# Altium footprint library 电容.PcbLib: 186 footprints (part 8 of 12)
Each footprint in its own frame and in the unit in brackets; x right, y up, seen from the top. Pads: shape width x height; smd on the part's side, far side on the other; paste and mask are expansions set on the pad; w line width, h text height; cw(c..) or ccw(c..) is an arc to the next point about the centre after c.
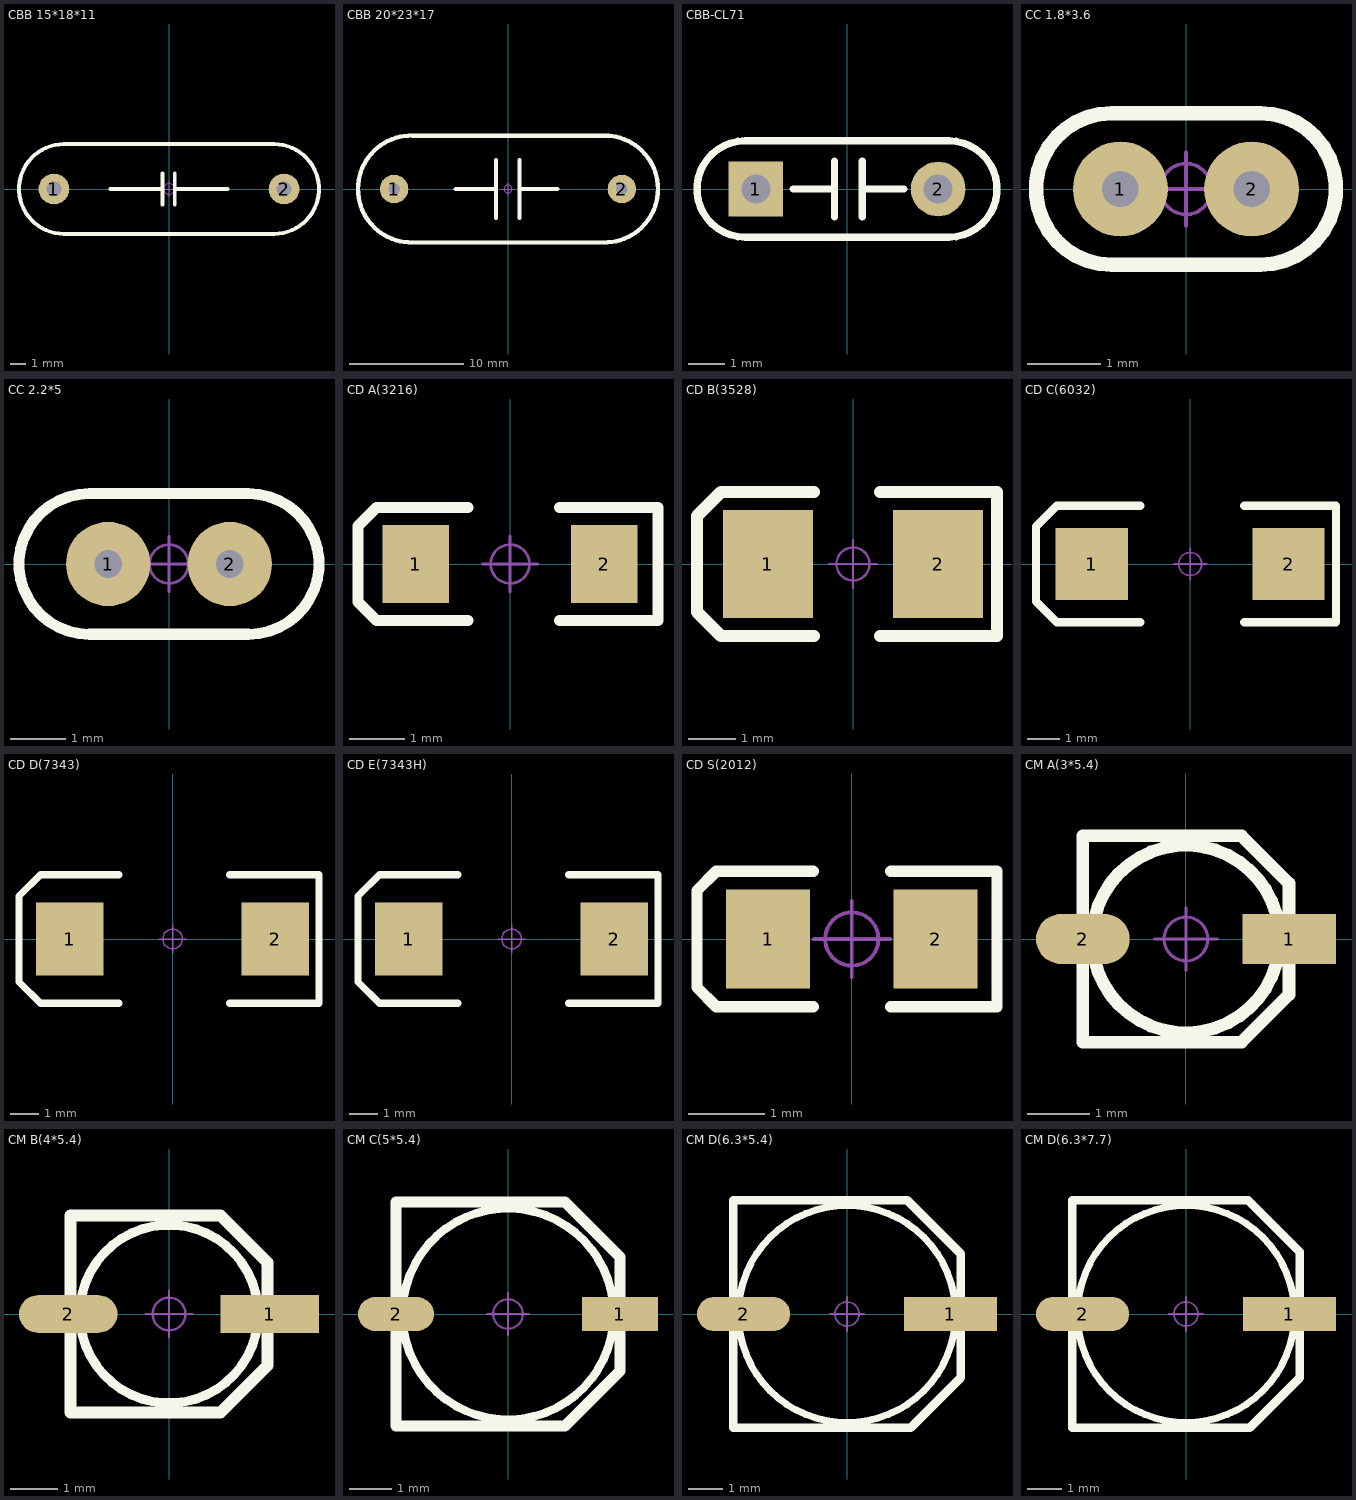
[diagram p7: the footprints below, top view; thin cyan lines are the x and y axes]

## CBB 15*18*11 [mm] "脚距15mm高18mm厚11mm"
pads (2):
  round 2 hole 1: 1(-7.5,0) 2(7.5,0)
Top Overlay:
  lines w0.254: -6.858,-2.921 6.858,-2.921 ccw(c6.858,0) 6.857,2.921 -6.858,2.921 ccw(c-6.858,0) -6.857,-2.921 ; -3.81,0 -0.515,0 ; -0.426,-1 -0.426,1 ; 0.374,-1 0.374,1 ; 0.501,0 3.81,0
Mechanical 15:
  circle w0.05: c0,0 r0.35
  lines w0.05: -0.5,0 0.5,0 ; 0,-0.5 0,0.5
3D body "CBB 15X18X11.STEP": height 11.53, standoff -3.47, extent -9,-2.75 9,2.75

## CBB 20*23*17 [mm] "脚距20mm高23mm厚17mm"
pads (2):
  round 2.5 hole 1: 1(-10,0) 2(10,0)
Top Overlay:
  lines w0.381: -8.382,4.682 8.89,4.682 ; -8.382,4.691 ccw(c-8.476,0) -8.382,-4.691 8.382,-4.691 ccw(c8.476,0) 8.382,4.691 ; -4.572,0 -1.277,0 ; -1.054,-2.54 -1.054,2.54 ; 1.016,-2.54 1.016,2.54 ; 1.016,0 4.318,0
Mechanical 15:
  circle w0.05: c0,0 r0.35
  lines w0.05: -0.5,0 0.5,0 ; 0,-0.5 0,0.5
3D body "CBB 20X23X17.STEP": height 17.53, standoff -3.47, extent -11.5,-4.5 11.5,4.5

## CBB-CL71 [mm] "7.2mm*2.3mm*6.5mm(长*宽*高）"
pads (2):
  rect 1.5x1.5 hole 0.8: 1(-2.5,0)
  round 1.5 hole 0.8: 2(2.5,0)
Top Overlay:
  lines w0.2: -1.484,0 -0.341,0 ; -0.341,-0.762 -0.341,0.762 ; 0.421,-0.762 0.421,0.762 ; 0.421,0 1.564,0 ; -2.794,-1.321 cw(c-2.794,0) -2.794,1.321 2.794,1.321 cw(c2.794,0) 2.794,-1.321 -2.794,-1.321
3D body "CL71.STEP": height 6.55, standoff -3.45, extent -3.6,-1.15 3.6,1.15

## CC 1.8*3.6 [mm] "脚距1.8mm直径3.6mm"
pads (2):
  round 1.3 hole 0.5: 1(-0.9,0) 2(0.9,0)
Top Overlay:
  lines w0.2: -1.016,-1.041 cw(c-1.016,0) -1.016,1.041 1.016,1.041 cw(c1.016,0) 1.016,-1.041 -1.016,-1.041
Mechanical 15:
  circle w0.05: c0,0 r0.35
  lines w0.05: -0.5,0 0.5,0 ; 0,-0.5 0,0.5
3D body "CC 1.8X3.6.STEP": height 3.6, standoff -3.5, extent -1.8,-0.798 1.8,0.796

## CC 2.2*5 [mm] "脚距2.2mm直径5mm"
height 6.35
pads (2):
  round 1.524 hole 0.5: 1(-1.1,0) 2(1.1,0)
Top Overlay:
  lines w0.2: -1.44,-1.271 cw(c-1.44,0) -1.44,1.271 1.44,1.271 cw(c1.44,0) 1.44,-1.271 -1.44,-1.269
Mechanical 15:
  circle w0.05: c0,0 r0.35
  lines w0.05: -0.5,0 0.5,0 ; 0,-0.5 0,0.5
3D body "CC 2.2X5.STEP": height 4.8, standoff -3.5, extent -2.4,-0.917 2.4,0.918

## CD A(3216) [mm] "长3.2mm，宽1.6mm，厚1.6mm"
pads (2):
  rect 1.2x1.4 smd: 1(-1.7,0) 2(1.7,0)
Top Overlay:
  lines w0.2: -0.762,-1.016 -2.413,-1.016 -2.743,-0.686 -2.743,0.686 -2.413,1.016 -0.762,1.016 ; 0.889,-1.016 2.667,-1.016 2.667,1.016 0.889,1.016
Mechanical 15:
  circle w0.05: c0,0 r0.35
  lines w0.05: -0.5,0 0.5,0 ; 0,-0.5 0,0.5
3D body "CD A(3216).STEP": height 1.6, standoff -0.01, extent -1.6,-0.8 1.6,0.8

## CD B(3528) [mil] "长3.5mm，宽2.8mm，厚1.9mm"
pads (2):
  rect 75x90 smd: 1(-70.87,-0.01) 2(70.86,-0.01)
Top Overlay:
  lines w10: -32.51,-60 -110,-60 -130,-40 -130,40 -110,60 -32.51,60 ; 22.49,-60 120,-60 120,60 22.49,60
Mechanical 15:
  circle w1.97: c0,0 r13.78
  lines w1.97: -19.68,0 19.68,0 ; 0,-19.68 0,19.68
3D body "CD B(3528).STEP": height 74.84, standoff -0.3, extent -68.92,-55.12 68.91,55.11

## CD C(6032) [mm] "长6.0mm，宽3.2mm，厚2.5mm"
pads (2):
  rect 2.2x2.2 smd: 1(-3,0) 2(3,0)
Top Overlay:
  lines w0.254: -1.524,-1.778 -4.064,-1.778 -4.699,-1.143 -4.699,1.143 -4.064,1.778 -1.524,1.778 ; 1.651,-1.778 4.445,-1.778 4.445,1.778 1.651,1.778
Mechanical 15:
  circle w0.05: c0,0 r0.35
  lines w0.05: -0.5,0 0.5,0 ; 0,-0.5 0,0.5
3D body "CD C(6032).STEP": height 2.5, standoff -0.01, extent -3,-1.6 3,1.6

## CD D(7343) [mm] "长7.3mm，宽4.3mm，厚2.8mm"
pads (2):
  rect 2.4x2.6 smd: 1(-3.65,0) 2(3.65,0)
Top Overlay:
  lines w0.254: -1.905,-2.286 -4.699,-2.286 -5.461,-1.524 -5.461,1.524 -4.699,2.286 -1.905,2.286 ; 2.032,-2.286 5.207,-2.286 5.207,2.286 2.032,2.286
Mechanical 15:
  circle w0.05: c0,0 r0.35
  lines w0.05: -0.5,0 0.5,0 ; 0,-0.5 0,0.5
3D body "CD D(7343H).STEP": height 2.8, standoff -0.01, extent -3.65,-2.15 3.65,2.15

## CD E(7343H) [mm] "长7.3mm，宽4.3mm，厚4.0mm"
pads (2):
  rect 2.4x2.6 smd: 1(-3.65,0) 2(3.65,0)
Top Overlay:
  lines w0.254: -1.905,-2.286 -4.699,-2.286 -5.461,-1.524 -5.461,1.524 -4.699,2.286 -1.905,2.286 ; 2.032,-2.286 5.207,-2.286 5.207,2.286 2.032,2.286
Mechanical 15:
  circle w0.05: c0,0 r0.35
  lines w0.05: -0.5,0 0.5,0 ; 0,-0.5 0,0.5
3D body "CD E(7343H).STEP": height 4, standoff -0.01, extent -3.65,-2.15 3.65,2.15

## CD S(2012) [mm] "长2.0mm，宽1.25mm，厚1.2mm"
pads (2):
  rect 1.1x1.3 smd: 1(-1.1,0) 2(1.1,0)
Top Overlay:
  lines w0.15: -0.508,-0.889 -1.778,-0.889 -2.032,-0.635 -2.032,0.254 -2.032,0.635 -1.778,0.889 -0.508,0.889 ; 0.508,-0.889 1.905,-0.889 1.905,0.889 0.508,0.889
Mechanical 15:
  circle w0.05: c0,0 r0.35
  lines w0.05: -0.5,0 0.5,0 ; 0,-0.5 0,0.5
3D body "CD S(2012).STEP": height 1.2, standoff 0, extent -1,-0.6 1,0.6

## CM A(3*5.4) [mm] "贴片电解电容，直径3mm，高5.4mm"
pads (2):
  rect 1.5x0.8 smd: 1(1.651,0)
  oval 1.5x0.8 smd: 2(-1.65,0)
Top Overlay:
  circle w0.203: c0,0 r1.5
  lines w0.203: -1.65,-1.65 -1.65,1.65 0.89,1.65 1.65,0.89 1.65,-0.89 0.89,-1.65 -1.65,-1.65
Mechanical 15:
  circle w0.05: c0,0 r0.35
  lines w0.05: -0.5,0 0.5,0 ; 0,-0.5 0,0.5
3D body "CM A(3X5.4).STEP": height 5.4, standoff -0.01, extent -1.9,-1.65 1.9,1.65

## CM B(4*5.4) [mm] "贴片电解电容，直径4mm，高5.4mm"
pads (2):
  rect 2.1x0.8 smd: 1(2.15,0)
  oval 2.1x0.8 smd: 2(-2.15,0)
Top Overlay:
  circle w0.2: c0,0 r1.9
  lines w0.254: -2.1,-2.1 1.1,-2.1 2.1,-1.1 2.1,1.1 1.1,2.1 -2.1,2.1 -2.1,-2.1
Mechanical 15:
  circle w0.05: c0,0 r0.35
  lines w0.05: -0.5,0 0.5,0 ; 0,-0.5 0,0.5
3D body "CM B(4X5.4).STEP": height 5.4, standoff -0.01, extent -2.3,-2.125 2.3,2.175

## CM C(5*5.4) [mm] "贴片电解电容，直径5mm，高5.4mm"
pads (2):
  rect 1.8x0.8 smd: 1(2.65,0)
  oval 1.8x0.8 smd: 2(-2.65,0)
Top Overlay:
  circle w0.2: c0,0 r2.5
  lines w0.254: -2.65,-2.65 1.35,-2.65 2.65,-1.35 2.65,1.35 1.35,2.65 -2.65,2.65 -2.65,-2.65
Mechanical 15:
  circle w0.05: c0,0 r0.35
  lines w0.05: -0.5,0 0.5,0 ; 0,-0.5 0,0.5
3D body "CM C(5X5.4).STEP": height 5.4, standoff -0.01, extent -2.95,-2.65 2.95,2.65

## CM D(6.3*5.4) [mm] "贴片电解电容，直径6.3mm，高5.4mm"
height 5.4
pads (2):
  rect 2.7x1 smd: 1(3,0)
  oval 2.7x1 smd: 2(-3,0)
Top Overlay:
  circle w0.2: c0,0 r3.15
  lines w0.254: -3.3,-3.3 -3.3,3.3 1.75,3.3 3.3,1.75 3.3,-1.85 1.85,-3.3 -3.3,-3.3
Mechanical 15:
  circle w0.05: c0,0 r0.35
  lines w0.05: -0.5,0 0.5,0 ; 0,-0.5 0,0.5
3D body "CM D(6.3X5.4).STEP": height 5.4, standoff -0.01, extent -3.5,-3.3 3.5,3.3

## CM D(6.3*7.7) [mm] "贴片电解电容，直径6.3mm，高7.7mm"
pads (2):
  rect 2.7x1 smd: 1(3,0)
  oval 2.7x1 smd: 2(-3,0)
Top Overlay:
  circle w0.2: c0,0 r3.15
  lines w0.254: -3.3,-3.3 -3.3,3.3 1.8,3.3 3.3,1.8 3.3,-1.85 1.85,-3.3 -3.3,-3.3
Mechanical 15:
  circle w0.05: c0,0 r0.35
  lines w0.05: -0.5,0 0.5,0 ; 0,-0.5 0,0.5
3D body "CM D(6.3X7.7).STEP": height 7.7, standoff -0.01, extent -3.5,-3.3 3.5,3.3